# Altium footprint library prtotype1.PcbLib: 29 footprints (part 1 of 2)
Each footprint in its own frame and in the unit in brackets; x right, y up, seen from the top. Pads: shape width x height; smd on the part's side, far side on the other; paste and mask are expansions set on the pad; w line width, h text height; cw(c..) or ccw(c..) is an arc to the next point about the centre after c.
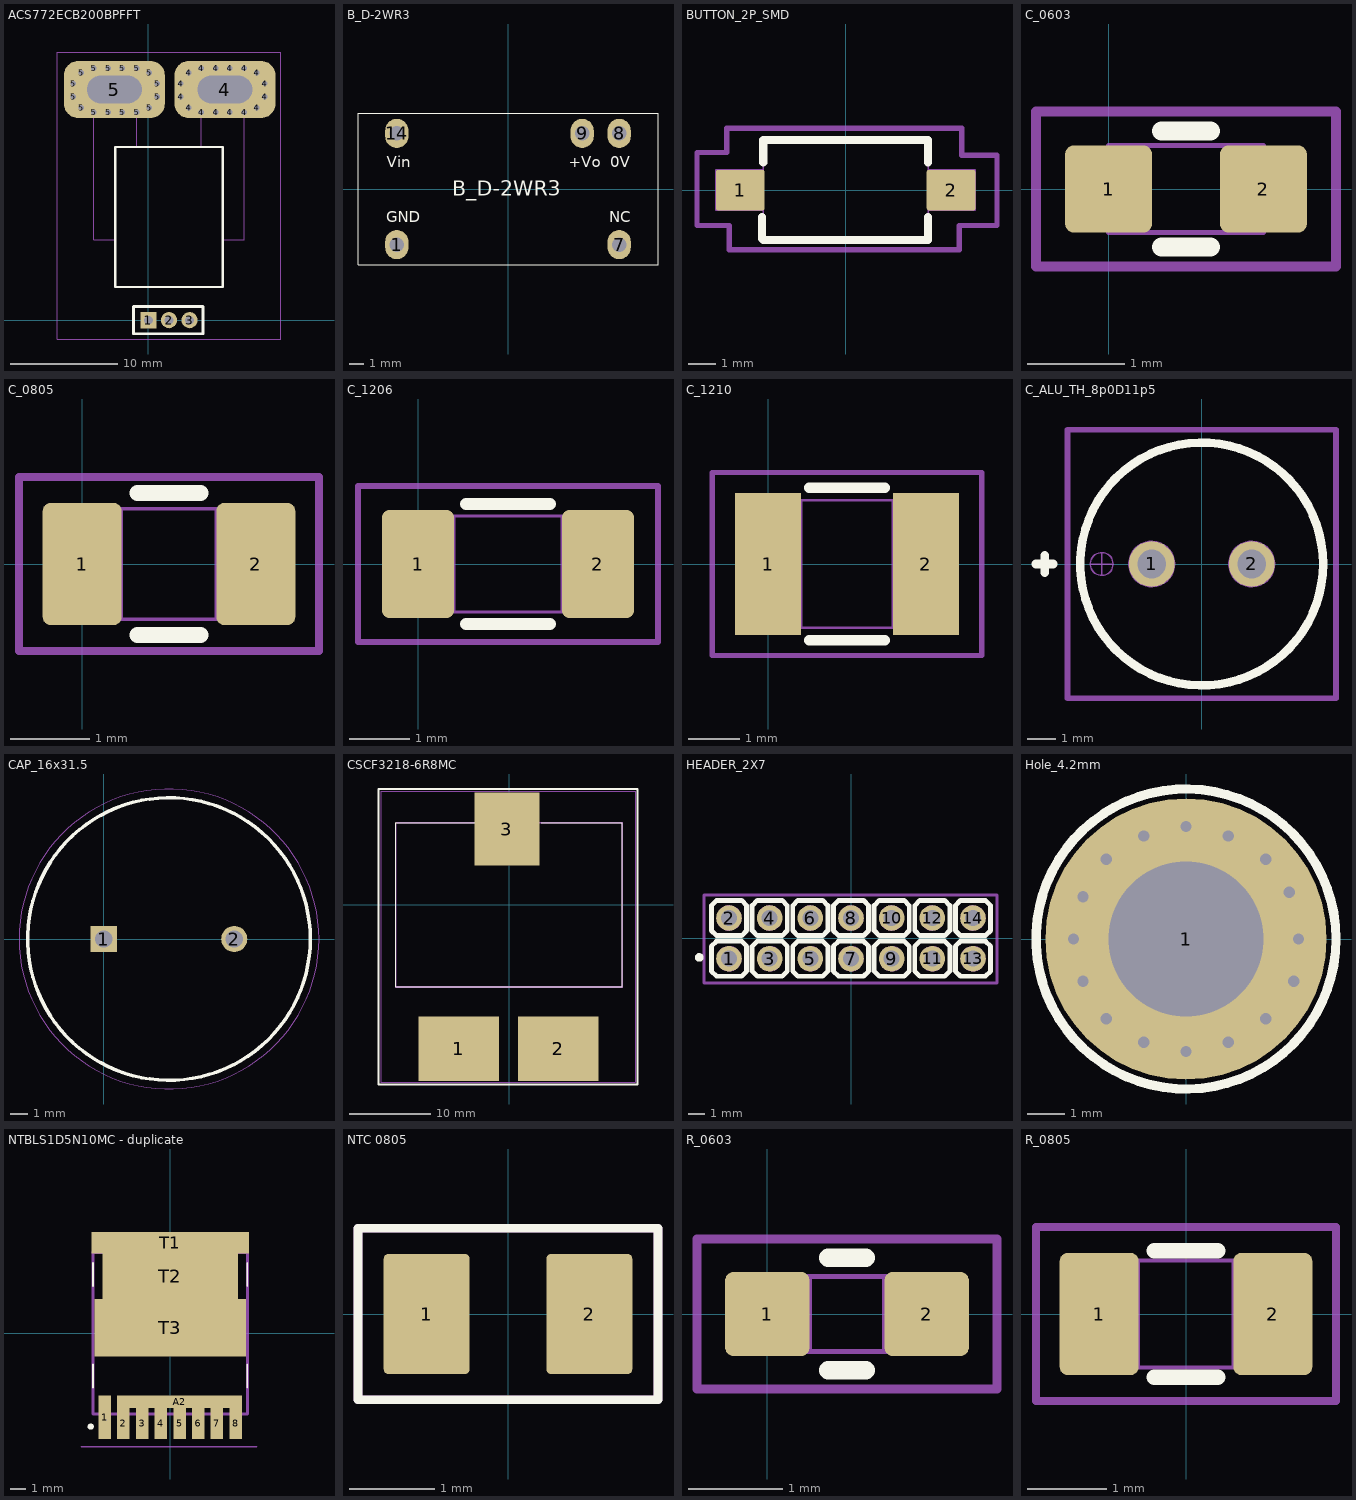
[diagram p0: the footprints below, top view; thin cyan lines are the x and y axes]

## ACS772ECB200BPFFT [mm]
pads (37):
  rect 1.5x1.5 hole 0.8: 1(0,0)
  round 1.5 hole 0.8: 2(1.91,0) 3(3.82,0)
  round 1 hole 0.5: 4(3.008,20.782) 4(3.008,22.018) 4(3.734,19.782) 4(3.734,23.018) 4(4.91,19.35) 4(4.91,23.45) 4(6.243,19.35) 4(6.243,23.45) 4(7.577,19.35) 4(7.577,23.45) 4(8.91,19.35) 4(8.91,23.45) 4(10.086,19.782) 4(10.086,23.018) 4(10.812,20.782) 4(10.812,22.018) 5(-6.992,20.782) 5(-6.992,22.018) 5(-6.266,19.782) 5(-6.266,23.018) 5(-5.09,19.35) 5(-5.09,23.45) 5(-3.757,19.35) 5(-3.757,23.45) 5(-2.423,19.35) 5(-2.423,23.45) 5(-1.09,19.35) 5(-1.09,23.45) 5(0.086,19.782) 5(0.086,23.018) 5(0.812,20.782) 5(0.812,22.018)
  rrect50% 9.398x5.334 hole 2.54 slot 5.08 at 0 deg: 4(7.11,21.463) 5(-3.175,21.463)
Top Overlay:
  lines w0.2: -3.09,3.1 6.91,3.1 6.91,16.1 -3.09,16.1 -3.09,3.1
  lines w0.254: -1.397,-1.27 5.08,-1.27 5.08,1.27 -1.397,1.27 -1.397,-1.27
Mechanical 13:
  lines w0.1: -3.09,7.5 -5.09,7.5 -5.09,20.3 -1.09,20.3 -1.09,16.1 ; 4.91,16.1 4.91,20.3 8.91,20.3 8.91,7.5 6.91,7.5 ; -3.09,3.1 6.91,3.1 6.91,16.1 -3.09,16.1 -3.09,3.1
Mechanical 15:
  lines w0.1: -8.492,-1.75 12.312,-1.75 12.312,24.95 -8.492,24.95 -8.492,-1.75
3D body "ACS758LCB-100B-PFF-T.stp": height 6.97, standoff -3.57, extent -5.062,-0.484 8.938,22.333

## B_D-2WR3 [mm]
pads (5):
  oval 1.6x2 hole 1: 1(-7.62,-3.81) 7(7.62,-3.81) 8(7.62,3.81) 9(5.08,3.81) 14(-7.62,3.81)
Top Overlay:
  lines w0.076: -10.285,-5.205 10.285,-5.205 10.285,5.205 -10.285,5.205 -10.285,-5.205
  text "NC" at 6.936,-2.268 h0.76
  text "Vin" at -8.32,1.491 h0.76
  text "GND" at -8.364,-2.268 h0.76
  text "0V" at 7.027,1.491 h0.76
  text "+Vo" at 4.16,1.491 h0.76
  text "B_D-2WR3" at -3.809,-0.475 h1.02
3D body "B_D-2WR3.stp": height 8.42, standoff -3.88, extent -10.16,-5.08 10.16,5.08

## BUTTON_2P_SMD [mm]
pads (2):
  rrect10% 1.8x1.5 smd mask+0.05: 1(-3.9,0.01) 2(3.9,0.01)
Top Overlay:
  lines w0.3: -3.1,-1.79 -3.1,-0.99 ; -3.05,-1.84 3.05,-1.84 3.05,-0.99 ; -3.05,1.035 -3.05,1.86 ; 2.2,1.86 -3.05,1.86 ; 3.05,1.035 3.05,1.86 -3.05,1.86
Mechanical 1:
  lines w0.05: -3.05,-0.74 -4.8,-0.74 -4.8,0.76 -3.05,0.76 ; 3.05,-0.74 4.8,-0.74 4.8,0.76 3.05,0.76 ; -3.05,-1.84 3.05,-1.84 3.05,1.86 -3.05,1.86 -3.05,-1.84
Mechanical 15:
  lines w0.2: -5.5,-1.3 -4.3,-1.3 -4.3,-2.2 4.2,-2.2 4.2,-1.3 5.6,-1.3 5.6,1.3 4.3,1.3 4.3,2.3 -4.4,2.3 -4.4,1.4 -5.5,1.4 -5.5,-1.3
3D body "User Library-KFC-2Pin SMD.step": height 4.2, standoff 0, extent -4.075,-1.665 3.925,1.835

## C_0603 [mm]
pads (2):
  rrect20% 0.9x0.9 smd mask+0.1: 1(0,0) 2(1.6,0)
Top Overlay:
  lines w0.2: 0.55,-0.6 1.05,-0.6 ; 0.55,0.6 1.05,0.6
Top Component Outline:
  lines w0.1: -0.75,-0.8 -0.75,0.8 2.35,0.8 2.35,-0.8 -0.75,-0.8
Top Assembly:
  lines w0.05: 0.4,-0.45 0.4,0.45 ; 1.2,-0.45 1.2,0.45 ; 0,-0.45 0,0.45 1.6,0.45 1.6,-0.45 0,-0.45
3D body "capacitor 0603.step": height 0.81, standoff 0.01, extent 0,-0.45 1.6,0.45

## C_0805 [mm]
pads (2):
  rrect20% 1x1.55 smd mask+0.1: 1(0,0) 2(2.2,0)
Top Overlay:
  lines w0.2: 0.7,-0.9 1.5,-0.9 ; 0.7,0.9 1.5,0.9
Mechanical 1:
  lines w0.05: 0.49,-0.7 0.49,0.7 ; 1.7,-0.7 1.7,0.675 ; 0,-0.7 0,0.7 2.2,0.7 2.2,-0.7 0,-0.7
Mechanical 15:
  lines w0.1: -0.8,-1.1 3,-1.1 3,1.1 -0.8,1.1 -0.8,-1.1
3D body "CAP0805.step": height 1.35, standoff 0, extent 0,-0.725 2.2,0.725

## C_1206 [mm]
pads (2):
  rrect20% 1.2x1.8 smd mask+0.1: 1(0,0) 2(3,0)
Top Overlay:
  lines w0.2: 0.8,-1 2.2,-1 ; 0.8,1 2.2,1
Mechanical 1:
  lines w0.05: 0.6,-0.8 0.6,0.8 ; 2.4,-0.8 2.4,0.8 ; -0.1,-0.8 3.1,-0.8 3.1,0.8 -0.1,0.8 -0.1,-0.8
Mechanical 15:
  lines w0.1: -1,-1.3 -1,1.3 4,1.3 4,-1.3 -1,-1.3
3D body "capacitor 1206.step": height 1, standoff 0, extent -0.1,-0.8 3.1,0.8

## C_1210 [mm]
pads (2):
  rect 1.3x2.8 smd mask+0.1: 1(0,0) 2(3.1,0)
Top Overlay:
  lines w0.2: 0.8,-1.5 2.3,-1.5 ; 0.8,1.5 2.3,1.5
Mechanical 1:
  lines w0.05: 0.65,-1.25 0.65,1.25 ; 2.45,-1.25 2.45,1.25 ; -0.05,-1.25 3.15,-1.25 3.15,1.25 -0.05,1.25 -0.05,-1.25
Mechanical 15:
  lines w0.1: -1.1,-1.8 -1.1,1.8 4.2,1.8 4.2,-1.8 -1.1,-1.8
3D body "CAP1210a.step": height 1.1, standoff 0, extent -0.09,-1.25 3.19,1.25

## C_ALU_TH_8p0D11p5 [mm]
pads (2):
  round 1.6 hole 1 mask+0.1: 1(-1.75,0) 2(1.75,0)
Top Overlay:
  circle w0.3: c0,0 r4.25
  lines w0.3: -5.8,0 -5.2,0 ; -5.5,-0.3 -5.5,0.3
Mechanical 1:
  circle w0.05: c0,0 r4.25
  circle w0.05: c1.75,0 r0.8
  circle w0.05: c-1.75,0 r0.8
  circle w0.05: c-3.5,0 r0.4
  lines w0.05: -3.9,0 -3.1,0 ; -3.5,-0.4 -3.5,0.4
Mechanical 15:
  lines w0.2: -4.7,-4.7 -4.7,4.7 4.7,4.7 4.7,-4.7 -4.7,-4.7
3D body "CAP8x11.5.step": height 11.53, standoff -3.98, extent -4.025,-4.025 4.025,4.025

## CAP_16x31.5 [mm]
pads (2):
  rect 1.5x1.5 hole 1: 1(0,0)
  round 1.5 hole 1: 2(7.5,0)
Top Overlay:
  circle w0.2: c3.75,0 r8.125
Mechanical 13:
  circle w0.1: c3.75,0 r8.125
Mechanical 15:
  circle w0.05: c3.75,0 r8.625
3D body "User Library-Cap-EL(16x31_5-7_5)T.STEP": height 41, standoff -3, extent -4.19,-8 11.812,8

## CSCF3218-6R8MC [mm]
pads (3):
  rect 10x8 smd: 1(-6.223,-17.78) 2(6.096,-17.78)
  rect 8x9 smd: 3(-0.254,9.398)
Top Overlay:
  lines w0.1: -14,-10.15 -14,10.15 ; -14,-10.15 -14,10.15 ; -14,-10.15 14,-10.15 ; -14,-10.15 14,-10.15 ; -14,10.15 -4,10.15 -14,10.15 ; 14,-10.15 14,10.15 ; 14,-10.15 14,10.15 ; 14,10.15 4,10.15 14,10.15
  lines w0.2: -5.2,-17.9 ccw(c-5.15,-17.9) -5.1,-17.9 ; -5.2,-17.9 cw(c-5.15,-17.9) -5.1,-17.9 ; -5.2,-17.9 ccw(c-5.15,-17.9) -5.1,-17.9
  lines w0.254: -16.129,-22.225 15.875,-22.225 15.875,14.351 -16.129,14.351 -16.129,-22.225
Mechanical 13:
  lines w0.2: -14,-10.15 14,-10.15 14,10.15 -14,10.15 -14,-10.15
Mechanical 15:
  lines w0.1: -15.875,-21.971 -15.875,14.097 15.621,14.097 15.621,-21.971 6.765,-21.971 1.668,-21.971 -1.668,-21.971 -6.765,-21.971 -15.875,-21.971
3D body "7443640330B.stp": height 18.25, standoff -0.27, extent -14,-16.4 14,10.6

## HEADER_2X7 [mm]
pads (14):
  round 1.6 hole 1 mask+0.1: 1(-7.64,-1.28) 2(-7.64,1.26) 3(-5.1,-1.28) 4(-5.1,1.26) 5(-2.56,-1.28) 6(-2.56,1.26) 7(-0.02,-1.28) 8(-0.02,1.26) 9(2.52,-1.28) 10(2.52,1.26) 11(5.06,-1.28) 12(5.06,1.26) 13(7.6,-1.28) 14(7.6,1.26)
Top Overlay:
  circle w0.254: c-9.5,-1.2 r0.141
  lines w0.3: -8.74,-2.06 -8.74,-0.5 -8.42,-0.18 -6.86,-0.18 -6.54,-0.5 -6.54,-2.06 -6.86,-2.38 -8.42,-2.38 -8.74,-2.06 ; -8.74,0.48 -8.42,0.16 -6.86,0.16 -6.54,0.48 -6.54,2.04 -6.86,2.36 -8.42,2.36 -8.74,2.04 -8.74,0.48 ; -6.2,-2.06 -6.2,-0.5 -5.88,-0.18 -4.32,-0.18 -4,-0.5 -4,-2.06 -4.32,-2.38 -5.88,-2.38 -6.2,-2.06 ; -6.2,0.48 -5.88,0.16 -4.32,0.16 -4,0.48 -4,2.04 -4.32,2.36 -5.88,2.36 -6.2,2.04 -6.2,0.48 ; -3.66,-2.06 -3.66,-0.5 -3.34,-0.18 -1.78,-0.18 -1.46,-0.5 -1.46,-2.06 -1.78,-2.38 -3.34,-2.38 -3.66,-2.06 ; -3.66,0.48 -3.34,0.16 -1.78,0.16 -1.46,0.48 -1.46,2.04 -1.78,2.36 -3.34,2.36 -3.66,2.04 -3.66,0.48 ; -1.12,-2.06 -1.12,-0.5 -0.8,-0.18 0.76,-0.18 1.08,-0.5 1.08,-2.06 0.76,-2.38 -0.8,-2.38 -1.12,-2.06 ; -1.12,0.48 -0.8,0.16 0.76,0.16 1.08,0.48 1.08,2.04 0.76,2.36 -0.8,2.36 -1.12,2.04 -1.12,0.48 ; 1.42,-2.06 1.42,-0.5 1.74,-0.18 3.3,-0.18 3.62,-0.5 3.62,-2.06 3.3,-2.38 1.74,-2.38 1.42,-2.06 ; 1.42,0.48 1.74,0.16 3.3,0.16 3.62,0.48 3.62,2.04 3.3,2.36 1.74,2.36 1.42,2.04 1.42,0.48 ; 3.96,-2.06 3.96,-0.5 4.28,-0.18 5.84,-0.18 6.16,-0.5 6.16,-2.06 5.84,-2.38 4.28,-2.38 3.96,-2.06 ; 3.96,0.48 4.28,0.16 5.84,0.16 6.16,0.48 6.16,2.04 5.84,2.36 4.28,2.36 3.96,2.04 3.96,0.48 ; 6.5,-2.06 6.5,-0.5 6.82,-0.18 8.38,-0.18 8.7,-0.5 8.7,-2.06 8.38,-2.38 6.82,-2.38 6.5,-2.06 ; 6.5,0.48 6.82,0.16 8.38,0.16 8.7,0.48 8.7,2.04 8.38,2.36 6.82,2.36 6.5,2.04 6.5,0.48
Mechanical 1:
  circle w0.05: c7.6,-1.28 r0.762
  circle w0.05: c5.06,-1.28 r0.762
  circle w0.05: c2.52,-1.28 r0.762
  circle w0.05: c-0.02,-1.28 r0.762
  circle w0.05: c-2.56,-1.28 r0.762
  circle w0.05: c-5.1,-1.28 r0.762
  circle w0.05: c-7.64,-1.28 r0.762
  circle w0.05: c-7.64,1.26 r0.762
  circle w0.05: c-5.1,1.26 r0.762
  circle w0.05: c-2.56,1.26 r0.762
  circle w0.05: c-0.02,1.26 r0.762
  circle w0.05: c2.52,1.26 r0.762
  circle w0.05: c5.06,1.26 r0.762
  circle w0.05: c7.6,1.26 r0.762
  lines w0.05: -8.74,-2.06 -8.42,-2.38 -6.86,-2.38 -6.54,-2.06 -6.54,-0.5 -6.86,-0.18 -8.42,-0.18 -8.74,-0.5 -8.74,-2.06 ; -8.74,0.48 -8.74,2.04 -8.42,2.36 -6.86,2.36 -6.54,2.04 -6.54,0.48 -6.86,0.16 -8.42,0.16 -8.74,0.48 ; -6.2,-2.06 -5.88,-2.38 -4.32,-2.38 -4,-2.06 -4,-0.5 -4.32,-0.18 -5.88,-0.18 -6.2,-0.5 -6.2,-2.06 ; -6.2,0.48 -6.2,2.04 -5.88,2.36 -4.32,2.36 -4,2.04 -4,0.48 -4.32,0.16 -5.88,0.16 -6.2,0.48 ; -3.66,-2.06 -3.34,-2.38 -1.78,-2.38 -1.46,-2.06 -1.46,-0.5 -1.78,-0.18 -3.34,-0.18 -3.66,-0.5 -3.66,-2.06 ; -3.66,0.48 -3.66,2.04 -3.34,2.36 -1.78,2.36 -1.46,2.04 -1.46,0.48 -1.78,0.16 -3.34,0.16 -3.66,0.48 ; -1.12,-2.06 -0.8,-2.38 0.76,-2.38 1.08,-2.06 1.08,-0.5 0.76,-0.18 -0.8,-0.18 -1.12,-0.5 -1.12,-2.06 ; -1.12,0.48 -1.12,2.04 -0.8,2.36 0.76,2.36 1.08,2.04 1.08,0.48 0.76,0.16 -0.8,0.16 -1.12,0.48 ; 1.42,-2.06 1.74,-2.38 3.3,-2.38 3.62,-2.06 3.62,-0.5 3.3,-0.18 1.74,-0.18 1.42,-0.5 1.42,-2.06 ; 1.42,0.48 1.42,2.04 1.74,2.36 3.3,2.36 3.62,2.04 3.62,0.48 3.3,0.16 1.74,0.16 1.42,0.48 ; 3.96,-2.06 4.28,-2.38 5.84,-2.38 6.16,-2.06 6.16,-0.5 5.84,-0.18 4.28,-0.18 3.96,-0.5 3.96,-2.06 ; 3.96,0.48 3.96,2.04 4.28,2.36 5.84,2.36 6.16,2.04 6.16,0.48 5.84,0.16 4.28,0.16 3.96,0.48 ; 6.5,-2.06 6.82,-2.38 8.38,-2.38 8.7,-2.06 8.7,-0.5 8.38,-0.18 6.82,-0.18 6.5,-0.5 6.5,-2.06 ; 6.5,0.48 6.5,2.04 6.82,2.36 8.38,2.36 8.7,2.04 8.7,0.48 8.38,0.16 6.82,0.16 6.5,0.48
  text "13" at 6.96,-1.68 h0.76
  text "9" at 2.32,-1.68 h0.76
  text "1" at -7.76,-1.68 h0.76
  text "3" at -5.36,-1.68 h0.76
  text "5" at -2.78,-1.68 h0.76
  text "7" at -0.28,-1.68 h0.76
  text "11" at 4.56,-1.68 h0.76
  text "12" at 4.46,0.86 h0.76
  text "8" at -0.28,0.86 h0.76
  text "6" at -2.78,0.86 h0.76
  text "4" at -5.36,0.86 h0.76
  text "2" at -7.76,0.86 h0.76
  text "10" at 1.96,0.86 h0.76
  text "14" at 6.96,0.86 h0.76
Mechanical 15:
  lines w0.2: -9.2,-2.8 -9.2,2.7 9.1,2.7 9.1,-2.8 -9.2,-2.8
3D body "HEADER1.step": height 5.94, standoff -2.94, extent 6.3,-2.58 8.84,-0.04
3D body "HEADER1.step": height 5.94, standoff -2.94, extent 6.3,-0.04 8.84,2.5
3D body "HEADER1.step": height 5.94, standoff -2.94, extent 3.76,-2.58 6.3,-0.04
3D body "HEADER1.step": height 5.94, standoff -2.94, extent 3.76,-0.04 6.3,2.5
3D body "HEADER1.step": height 5.94, standoff -2.94, extent 3.76,-0.04 6.3,2.5
3D body "HEADER1.step": height 5.94, standoff -2.94, extent 1.22,-2.58 3.76,-0.04
3D body "HEADER1.step": height 5.94, standoff -2.94, extent -1.32,-2.58 1.22,-0.04
3D body "HEADER1.step": height 5.94, standoff -2.94, extent 1.22,-0.04 3.76,2.5
3D body "HEADER1.step": height 5.94, standoff -2.94, extent -1.32,-0.04 1.22,2.5
3D body "HEADER1.step": height 5.94, standoff -2.94, extent -3.86,-2.58 -1.32,-0.04
3D body "HEADER1.step": height 5.94, standoff -2.94, extent -3.86,-0.04 -1.32,2.5
3D body "HEADER1.step": height 5.94, standoff -2.94, extent -3.86,-0.04 -1.32,2.5
3D body "HEADER1.step": height 5.94, standoff -2.94, extent -6.4,-2.58 -3.86,-0.04
3D body "HEADER1.step": height 5.94, standoff -2.94, extent -8.94,-2.58 -6.4,-0.04
3D body "HEADER1.step": height 5.94, standoff -2.94, extent -6.4,-0.04 -3.86,2.5
3D body "HEADER1.step": height 5.94, standoff -2.94, extent -8.94,-0.04 -6.4,2.5

## Hole_4.2mm [mil]
pads (1):
  round 300 hole 165 mask+0: 1(0,0)
via -110,-45 diameter 30 hole 12
via -85,-85 diameter 30 hole 12
via -45,-110 diameter 30 hole 12
via 85,-85 diameter 30 hole 12
via 115,-45 diameter 30 hole 12
via 45,-110 diameter 30 hole 12
via 45,110 diameter 30 hole 12
via 85,85 diameter 30 hole 12
via 110,50 diameter 30 hole 12
via -110,45 diameter 30 hole 12
via -85,85 diameter 30 hole 12
via -45,110 diameter 30 hole 12
via -120,0 diameter 30 hole 12
via 0,-120 diameter 30 hole 12
via 0,120 diameter 30 hole 12
via 120,0 diameter 30 hole 12
Top Overlay:
  circle w10: c0,0 r160

## NTBLS1D5N10MC - duplicate [mm]
pads (12):
  rect 0.8x2.8 smd: 1(-4.2,-5.4)
  rect 0.8x2 smd: 2(-3,-5.8) 3(-1.8,-5.8) 4(-0.6,-5.8) 5(0.6,-5.8) 6(1.8,-5.8) 7(3,-5.8) 8(4.2,-5.8)
  rect 8x0.8 smd: A2(0.6,-4.4)
  rect 10.1x1.4 smd: T1(0,5.8)
  rect 8.7x2.9 smd: T2(0,3.65)
  rect 9.7x3.7 smd: T3(0,0.35)
Top Overlay:
  lines w0.1: -4.95,-3.5 -4.95,-2 ; -4.95,3 -4.95,4.5 ; 4.95,-3.5 4.95,-2 ; 4.95,3 4.95,4.5
  lines w0.2: -5.1,-6.1 ccw(c-5.1,-6) -5.1,-5.9 ccw(c-5.1,-6) -5.1,-6.1
Mechanical 13:
  lines w0.2: -4.95,-5.185 -4.95,5.185 4.95,5.185 4.95,-5.185 -4.95,-5.185
Mechanical 15:
  lines w0.1: -5.7,-7.3 5.55,-7.3
3D body "User Library-H-PSOF-8-1.STEP": height 2.3, standoff 0, extent -4.95,-5.202 4.95,6.473

## NTC 0805 [mm]
pads (2):
  rrect10% 1x1.4 smd mask+0.07: 1(-0.95,0) 2(0.95,0)
Top Overlay:
  lines w0.1: -1.75,-1 1.75,-1 1.75,1 -1.75,1 -1.75,-1
Top Assembly:
  lines w0.1: -1.75,-1 1.75,-1 1.75,1 -1.75,1 -1.75,-1
3D body "User Library-NTC 0805.STEP": height 0.61, standoff 0, extent -1.181,-0.51 1.181,0.51

## R_0603 [mm]
pads (2):
  rrect20% 0.9x0.9 smd mask+0.1: 1(0,0)
  rrect20% 0.9x0.9 smd: 2(1.7,0)
Top Overlay:
  lines w0.2: 0.65,-0.6 1.05,-0.6 ; 0.65,0.6 1.05,0.6
Top Component Outline:
  lines w0.1: -0.75,-0.8 -0.75,0.8 2.45,0.8 2.45,-0.8 -0.75,-0.8
Top Assembly:
  lines w0.05: 0.45,-0.4 0.45,0.4 ; 1.25,-0.4 1.25,0.4 ; 0.05,-0.4 0.05,0.4 1.65,0.4 1.65,-0.4 0.05,-0.4
3D body "RES0603.step": height 0.56, standoff 0, extent 0,-0.4 1.7,0.4

## R_0805 [mm]
pads (2):
  rrect20% 1x1.55 smd mask+0.1: 1(-1.1,0)
  rrect20% 1x1.55 smd: 2(1.1,0)
Top Overlay:
  lines w0.2: -0.4,-0.8 0.4,-0.8 ; -0.4,0.8 0.4,0.8
Mechanical 1:
  lines w0.05: -0.61,-0.675 -0.61,0.675 ; 0.6,-0.66 0.6,0.675 ; -1.1,-0.675 -1.1,0.675 1.1,0.675 1.1,-0.675 -1.1,-0.675
Mechanical 15:
  lines w0.1: -1.9,-1.1 1.9,-1.1 1.9,1.1 -1.9,1.1 -1.9,-1.1
3D body "User Library-RES_2013-0805.step": height 0.76, standoff 0, extent -1.15,-0.695 1.15,0.655